# Altium footprint library 3D_MIG_Controller.PCBLIB: 560 footprints (part 1 of 35)
Each footprint in its own frame and in the unit in brackets; x right, y up, seen from the top. Pads: shape width x height; smd on the part's side, far side on the other; paste and mask are expansions set on the pad; w line width, h text height; cw(c..) or ccw(c..) is an arc to the next point about the centre after c.
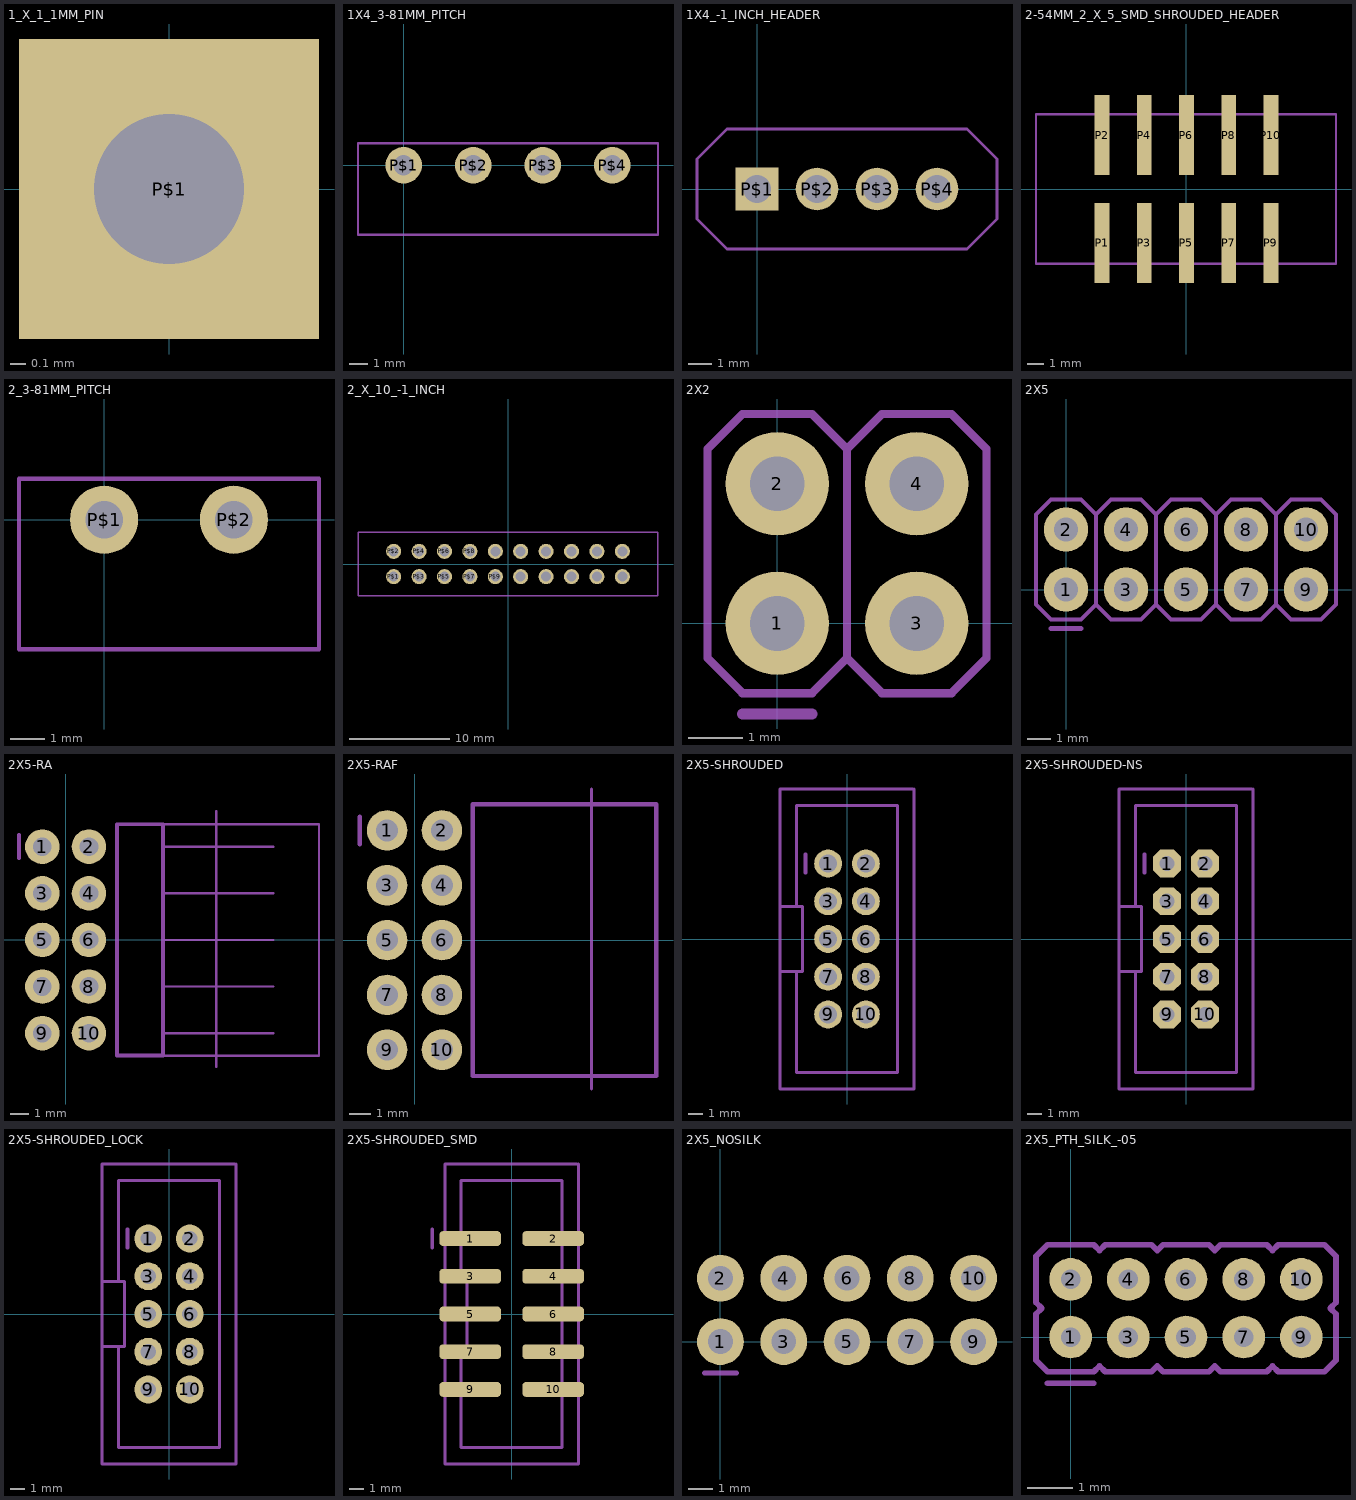
[diagram p0: the footprints below, top view; thin cyan lines are the x and y axes]

## 1_X_1_1MM_PIN [mm]
pads (1):
  rect 2x2 / inner round 1.848 / far side rect 2x2 hole 1: P$1(0,0)

## 1X4_3-81MM_PITCH [mm]
pads (4):
  round 2 hole 1.1: P$1(0,0) P$2(3.81,0) P$3(7.62,0) P$4(11.43,0)
tPlace:
  lines w0.127: -2.5,-3.8 -2.5,1.2 13.93,1.2 13.93,-3.8 -2.5,-3.8

## 1X4_-1_INCH_HEADER [mil]
pads (4):
  rect 70.86x70.86 / inner round 65.47 / far side rect 70.86x70.86 hole 47.24: P$1(0,0)
  round 70.86 hole 47.24: P$2(100,0) P$3(200,0) P$4(300,0)
tPlace:
  lines w5: -100,-50 -100,50 -50,100 350,100 400,50 400,-50 350,-100 -50,-100 -100,-50

## 2-54MM_2_X_5_SMD_SHROUDED_HEADER [mm]
pads (10):
  rect 0.89x4.8 smd: P1(-5.08,-3.25) P2(-5.08,3.25) P3(-2.54,-3.25) P4(-2.54,3.25) P5(0,-3.25) P6(0,3.25) P7(2.54,-3.25) P8(2.54,3.25) P9(5.08,-3.25) P10(5.08,3.25)
tDocu:
  lines w0.127: -9.06,-4.5 9,-4.5 9,4.5 -9.06,4.5 -9.06,-4.5

## 2_3-81MM_PITCH [mm]
pads (2):
  round 2 hole 1.1: P$1(0,0) P$2(3.81,0)
tPlace:
  lines w0.127: -2.5,-3.8 -2.5,1.2 6.31,1.2 6.31,-3.8 -2.5,-3.8

## 2_X_10_-1_INCH [mm]
pads (20):
  round 1.508 hole 1: P$1(-11.43,-1.27) P$2(-11.43,1.27) P$3(-8.89,-1.27) P$4(-8.89,1.27) P$5(-6.35,-1.27) P$6(-6.35,1.27) P$7(-3.81,-1.27) P$8(-3.81,1.27) P$9(-1.27,-1.27) P$10(-1.27,1.27) P$11(1.27,-1.27) P$12(1.27,1.27) P$13(3.81,-1.27) P$14(3.81,1.27) P$15(6.35,-1.27) P$16(6.35,1.27) P$17(8.89,-1.27) P$18(8.89,1.27) P$19(11.43,-1.27) P$20(11.43,1.27)
tPlace:
  lines w0.127: -15,-3.15 -15,3.15 15,3.15 15,-3.15 -15,-3.15

## 2X2 [mil]
pads (4):
  round 74 hole 39.37: 1(0,0) 2(0,100) 3(100,0) 4(100,100)
tDocu:
  region: 10,-10 -10,-10 -10,10 10,10
  region: 10,90 -10,90 -10,110 10,110
  region: 110,90 90,90 90,110 110,110
  region: 110,-10 90,-10 90,10 110,10
tPlace:
  lines w6: 50,-25 25,-50 -25,-50 -50,-25 -50,125 -25,150 25,150 50,125 ; 50,-25 75,-50 125,-50 150,-25 150,125 125,150 75,150 50,125 ; 50,-25 50,125
  lines w8: -25,-65 25,-65
bPlace:
  lines w8: -25,-65 25,-65

## 2X5 [mil]
pads (10):
  round 74 hole 39.37: 1(0,0) 2(0,100) 3(100,0) 4(100,100) 5(200,0) 6(200,100) 7(300,0) 8(300,100) 9(400,0) 10(400,100)
tDocu:
  region: 10,-10 -10,-10 -10,10 10,10
  region: 10,90 -10,90 -10,110 10,110
  region: 110,90 90,90 90,110 110,110
  region: 110,-10 90,-10 90,10 110,10
  region: 210,90 190,90 190,110 210,110
  region: 210,-10 190,-10 190,10 210,10
  region: 410,90 390,90 390,110 410,110
  region: 410,-10 390,-10 390,10 410,10
  region: 310,-10 290,-10 290,10 310,10
  region: 310,90 290,90 290,110 310,110
tPlace:
  lines w6: 50,-25 25,-50 -25,-50 -50,-25 -50,125 -25,150 25,150 50,125 ; 50,-25 75,-50 125,-50 150,-25 ; 50,-25 50,125 ; 50,125 75,150 125,150 150,125 ; 150,-25 175,-50 225,-50 250,-25 ; 150,-25 150,125 ; 150,125 175,150 225,150 250,125 ; 250,-25 275,-50 325,-50 350,-25 ; 250,-25 250,125 ; 250,125 275,150 325,150 350,125 ; 350,-25 350,125 ; 350,-25 375,-50 425,-50 450,-25 450,125 425,150 375,150 350,125
  lines w8: -25,-65 25,-65
bPlace:
  lines w8: -25,-65 25,-65

## 2X5-RA [mil]
pads (10):
  round 74 hole 40: 1(-50,200) 2(50,200) 3(-50,100) 4(50,100) 5(-50,0) 6(50,0) 7(-50,-100) 8(50,-100) 9(-50,-200) 10(50,-200)
tDocu:
  region: -60,210 -40,210 -40,190 -60,190
  region: 40,210 60,210 60,190 40,190
  region: 40,110 60,110 60,90 40,90
  region: -60,110 -40,110 -40,90 -60,90
  region: 40,10 60,10 60,-10 40,-10
  region: -60,10 -40,10 -40,-10 -60,-10
  region: 40,-90 60,-90 60,-110 40,-110
  region: -60,-90 -40,-90 -40,-110 -60,-110
  region: 40,-190 60,-190 60,-210 40,-210
  region: -60,-190 -40,-190 -40,-210 -60,-210
  region: -60,-90 -40,-90 -40,-110 -60,-110
  region: 40,-90 60,-90 60,-110 40,-110
  lines w5: 208.66,-248.03 543.31,-248.03 543.31,248.03 208.66,248.03 ; 208.66,-200 444.88,-200 ; 208.66,-100 444.88,-100 ; 208.66,0 444.88,0 ; 208.66,100 444.88,100 ; 208.66,200 444.88,200 ; 322.83,-271.65 322.83,275.59
tPlace:
  lines w8: -100,175 -100,225 ; 110.24,-248.03 208.66,-248.03 208.66,248.03 110.24,248.03 110.24,-248.03
bPlace:
  lines w8: -100,175 -100,225

## 2X5-RAF [mil]
pads (10):
  round 74 hole 40: 1(-50,200) 2(50,200) 3(-50,100) 4(50,100) 5(-50,0) 6(50,0) 7(-50,-100) 8(50,-100) 9(-50,-200) 10(50,-200)
tDocu:
  region: -60,210 -40,210 -40,190 -60,190
  region: 40,210 60,210 60,190 40,190
  region: 40,110 60,110 60,90 40,90
  region: -60,110 -40,110 -40,90 -60,90
  region: 40,10 60,10 60,-10 40,-10
  region: -60,10 -40,10 -40,-10 -60,-10
  region: 40,-90 60,-90 60,-110 40,-110
  region: -60,-90 -40,-90 -40,-110 -60,-110
  region: 40,-190 60,-190 60,-210 40,-210
  region: -60,-190 -40,-190 -40,-210 -60,-210
  region: -60,-90 -40,-90 -40,-110 -60,-110
  region: 40,-90 60,-90 60,-110 40,-110
  lines w5: 322.83,-271.65 322.83,275.59
tPlace:
  lines w8: -100,175 -100,225 ; 106.3,-248.03 440.94,-248.03 440.94,248.03 106.3,248.03 106.3,-248.03
bPlace:
  lines w8: -100,175 -100,225

## 2X5-SHROUDED [mil]
pads (10):
  round 74 hole 47.24: 1(-50,200) 2(50,200) 3(-50,100) 4(50,100) 5(-50,0) 6(50,0) 7(-50,-100) 8(50,-100) 9(-50,-200) 10(50,-200)
tDocu:
  region: -60,190 -60,210 -40,210 -40,190
  region: 40,190 40,210 60,210 60,190
  region: 40,90 40,110 60,110 60,90
  region: -60,90 -60,110 -40,110 -40,90
  region: 40,-10 40,10 60,10 60,-10
  region: -60,-10 -60,10 -40,10 -40,-10
  region: 40,-110 40,-90 60,-90 60,-110
  region: -60,-110 -60,-90 -40,-90 -40,-110
  region: 40,-210 40,-190 60,-190 60,-210
  region: -60,-210 -60,-190 -40,-190 -40,-210
  region: -60,-110 -60,-90 -40,-90 -40,-110
  region: 40,-110 40,-90 60,-90 60,-110
  lines w8: -133.86,-86.61 -133.86,-354.33 133.86,-354.33 133.86,354.33 -133.86,354.33 -133.86,86.61
tPlace:
  lines w8: -109.25,175 -109.25,225 ; 173.23,397.64 -177.17,397.64 -177.17,86.61 ; 177.17,397.64 177.17,-397.64 -177.17,-397.64 -177.17,-86.61 ; -177.17,-86.61 -177.17,86.61 ; -177.17,-86.61 -118.11,-86.61 -118.11,86.61 -177.17,86.61
bPlace:
  lines w8: -110.75,175 -110.75,225

## 2X5-SHROUDED-NS [mil]
pads (10):
  oct 74x74 / inner round 68.37 / far side oct 74x74 hole 40: 1(-50,200) 2(50,200) 3(-50,100) 4(50,100) 5(-50,0) 6(50,0) 7(-50,-100) 8(50,-100) 9(-50,-200) 10(50,-200)
tDocu:
  region: -60,190 -60,210 -40,210 -40,190
  region: 40,190 40,210 60,210 60,190
  region: 40,90 40,110 60,110 60,90
  region: -60,90 -60,110 -40,110 -40,90
  region: 40,-10 40,10 60,10 60,-10
  region: -60,-10 -60,10 -40,10 -40,-10
  region: 40,-110 40,-90 60,-90 60,-110
  region: -60,-110 -60,-90 -40,-90 -40,-110
  region: 40,-210 40,-190 60,-190 60,-210
  region: -60,-210 -60,-190 -40,-190 -40,-210
  region: -60,-110 -60,-90 -40,-90 -40,-110
  region: 40,-110 40,-90 60,-90 60,-110
  lines w8: -133.86,-86.61 -133.86,-354.33 133.86,-354.33 133.86,354.33 -133.86,354.33 -133.86,86.61 ; 173.23,397.64 -177.17,397.64 -177.17,86.61 ; 177.17,397.64 177.17,-397.64 -177.17,-397.64 -177.17,-86.61 ; -177.17,-86.61 -177.17,86.61 ; -177.17,-86.61 -118.11,-86.61 -118.11,86.61 -177.17,86.61
tPlace:
  lines w8: -109.25,175 -109.25,225
bPlace:
  lines w8: -110.75,175 -110.75,225

## 2X5-SHROUDED_LOCK [mil]
pads (10):
  round 74 hole 40: 1(-55,200) 2(55,200) 3(-55,100) 4(55,100) 5(-55,0) 6(55,0) 7(-55,-100) 8(55,-100) 9(-55,-200) 10(55,-200)
tDocu:
  region: -60,210 -40,210 -40,190 -60,190
  region: 40,210 60,210 60,190 40,190
  region: 40,110 60,110 60,90 40,90
  region: -60,110 -40,110 -40,90 -60,90
  region: 40,10 60,10 60,-10 40,-10
  region: -60,10 -40,10 -40,-10 -60,-10
  region: 40,-90 60,-90 60,-110 40,-110
  region: -60,-90 -40,-90 -40,-110 -60,-110
  region: 40,-190 60,-190 60,-210 40,-210
  region: -60,-190 -40,-190 -40,-210 -60,-210
  region: -60,-90 -40,-90 -40,-110 -60,-110
  region: 40,-90 60,-90 60,-110 40,-110
  lines w8: -133.86,-86.61 -133.86,-354.33 133.86,-354.33 133.86,354.33 -133.86,354.33 -133.86,86.61
tPlace:
  lines w8: -109.25,175 -109.25,225 ; 173.23,397.64 -177.17,397.64 -177.17,86.61 ; 177.17,397.64 177.17,-397.64 -177.17,-397.64 -177.17,-86.61 ; -177.17,-86.61 -177.17,86.61 ; -177.17,-86.61 -118.11,-86.61 -118.11,86.61 -177.17,86.61
bPlace:
  lines w8: -110.75,175 -110.75,225

## 2X5-SHROUDED_SMD [mil]
pads (10):
  rrect50% 163.39x39.37 smd: 1(-110,200) 2(110,200) 3(-110,100) 4(110,100) 5(-110,0) 6(110,0) 7(-110,-100) 8(110,-100) 9(-110,-200) 10(110,-200)
tDocu:
  region: -60,190 -60,210 -40,210 -40,190
  region: 40,190 40,210 60,210 60,190
  region: 40,90 40,110 60,110 60,90
  region: -60,90 -60,110 -40,110 -40,90
  region: 40,-10 40,10 60,10 60,-10
  region: -60,-10 -60,10 -40,10 -40,-10
  region: 40,-110 40,-90 60,-90 60,-110
  region: -60,-110 -60,-90 -40,-90 -40,-110
  region: 40,-210 40,-190 60,-190 60,-210
  region: -60,-210 -60,-190 -40,-190 -40,-210
  region: -60,-110 -60,-90 -40,-90 -40,-110
  region: 40,-110 40,-90 60,-90 60,-110
  lines w8: -133.86,-86.61 -133.86,-354.33 133.86,-354.33 133.86,354.33 -133.86,354.33 -133.86,86.61
tPlace:
  lines w8: -209.25,175 -209.25,225 ; 173.23,397.64 -177.17,397.64 -177.17,86.61 ; 177.17,397.64 177.17,-397.64 -177.17,-397.64 -177.17,-86.61 ; -177.17,-86.61 -177.17,86.61 ; -177.17,-86.61 -118.11,-86.61 -118.11,86.61 -177.17,86.61
bPlace:
  lines w8: -210.75,175 -210.75,225

## 2X5_NOSILK [mil]
pads (10):
  round 74 hole 39.37: 1(0,0) 2(0,100) 3(100,0) 4(100,100) 5(200,0) 6(200,100) 7(300,0) 8(300,100) 9(400,0) 10(400,100)
tDocu:
  region: 10,-10 -10,-10 -10,10 10,10
  region: 10,90 -10,90 -10,110 10,110
  region: 110,90 90,90 90,110 110,110
  region: 110,-10 90,-10 90,10 110,10
  region: 210,-10 190,-10 190,10 210,10
  region: 410,90 390,90 390,110 410,110
  region: 410,-10 390,-10 390,10 410,10
  region: 310,-10 290,-10 290,10 310,10
  region: 310,90 290,90 290,110 310,110
  region: 210,90 190,90 190,110 210,110
  lines w8: -25,-50 25,-50

## 2X5_PTH_SILK_-05 [mil]
pads (10):
  round 37 hole 17: 1(0,0) 2(0,50) 3(50,0) 4(50,50) 5(100,0) 6(100,50) 7(150,0) 8(150,50) 9(200,0) 10(200,50)
tPlace:
  lines w5: -20,-40 20,-40 ; -30,-20 -20,-30 20,-30 25,-25 30,-30 70,-30 75,-25 80,-30 120,-30 125,-25 130,-30 170,-30 175,-25 180,-30 220,-30 230,-20 230,20 225,25 230,30 230,70 220,80 180,80 175,75 170,80 130,80 125,75 120,80 80,80 75,75 70,80 30,80 25,75 20,80 -20,80 -30,70 -30,30 -25,25 -30,20 -30,-20
bPlace:
  lines w5: -20,-40 20,-40